# Altium schematic symbol library lib_datalogger.SchLib: 1246 symbols (part 12 of 16) (continued)
## CMP-018-000087-1 (continued)
RES SMD 180K OHM 1% 1/10W 0603; Manufacturer Part Number: RC0603FR-07180KL; Power (Watts): 0.1W, 1/10W; Temperature Coefficient: ±100ppm/°C; Number of Terminations: 2; Supplier Device Package: 0603; ComponentLink1URL: http://www.yageo.com/NewPortal/yageodocoutput?fileName=/pdf/R-Chip/PYu-RC_Group_51_RoHS_L_4.pdf; Features: Moisture Resistant; Stock 1: 371720; Package / Case: 0603 (1608 Metric); Size / Dimension: 0.063" L x 0.031" W (1.60mm x 0.80mm); Operating Temperature: -55°C ~ 155°C; Pricing 1: 1=0.1, 10=0.014, 25=0.01, 100=0.0057, 250=0.00436, 500=0.00348, 1000=0.00257, 2500=0.00223 (USD); Design Item ID: RES 180K OHM 1% 1/10W 0603 SMD; Source: mits.SchLib; Category: Resistors; ComponentLink1Description: http://www.yageo.com/NewPortal/yageodocoutput?fileName=/pdf/R-Chip/PYu-RC_Group_51_RoHS_L_4.pdf; Resistance (Ohms): 180k; RoHS: RoHS Compliant; Part Status: Active; Height - Seated (Max): 0.022" (0.55mm); Failure Rate: -
footprint CR1608-0603 (Chip Resistor; Body 1.6 x 0.8 mm (LxW typ))
footprint CR1608-0603 (Chip Resistor; Body 1.6 x 0.8 mm (LxW typ))
pins: 1, 2

## CMP-018-000088-1
designator R?, comment RES 1K OHM 1/10W 0.1% 0603 SMD  Package Quantity: 5000  Voltage Rating: 75V  Tolerance: 0.1%  Min Operating Temperature: -55°C  Manufacturer: Yageo  Max Operating Temperature: 155°C  RoHS Compliant: Yes  Packaging: Tape and Reel  Case/Package: 0603  Resistance: 1kR
YAGEO - RC0603JR-071KL - SMD Chip Resistor, 0603 [1608 Metric], 1 kohm, RC Series, 75 V, Thick Film, 100 mW; Power Rating: 100mW; Body Length: 1.6mm; Resistance Tolerance: 5%; Temperature Coefficient: 25ppm/°C; ComponentLink5Description: https://datasheet.ciiva.com/7746/443971-7746461.pdf?src-supplier=Element14; ComponentLink1Description: http://www.farnell.com/datasheets/2860647.pdf?src-supplier=Farnell; ComponentLink7URL: https://datasheet.ciiva.com/22747/443971-22747533.pdf?src-supplier=Element14; Radiation Hardening: No; Width: 0.8mm; Stock 2: 3076553; ComponentLink2Description: http://www.farnell.com/datasheets/1729042.pdf?src-supplier=Element14; Military Standard: Not; ComponentLink5URL: https://datasheet.ciiva.com/7746/443971-7746461.pdf?src-supplier=Element14; Case Code (Metric): 1608; REACH SVHC: No SVHC; RoHS: No; Category: Chip SMD Resistors; ComponentLink7Description: https://datasheet.ciiva.com/22747/443971-22747533.pdf?src-supplier=Element14; Design Item ID: RES 1K OHM 1/10W 0.1% 0603 SMD; ComponentLink6Description: https://datasheet.ciiva.com/7746/443971-7746462.pdf?src-supplier=Element14; Series: RC; ComponentLink3Description: http://www.farnell.com/datasheets/1729040.pdf?src-supplier=Element14; Pricing 2: 1=0,10000, 10=0,02000, 100=0,00800, 1000=0,00360, 2500=0,00312 (USD); ComponentLink1URL: http://www.farnell.com/datasheets/2860647.pdf?src-supplier=Farnell; ComponentLink4Description: https://datasheet.ciiva.com/8883/pyu-rc0603-51-rohs-l-4-8883051.pdf?src-supplier=Avnet; ComponentLink2URL: http://www.farnell.com/datasheets/1729042.pdf?src-supplier=Element14; Case Code (Imperial): 0603; Contact Plating: Tin,Matte; Length: 1.6mm; Lead Free: Lead Free; Height: 0.45mm; Construction: Rectangular; Depth: 0.8mm; Source: mits.SchLib; ComponentLink6URL: https://datasheet.ciiva.com/7746/443971-7746462.pdf?src-supplier=Element14; Voltage Rating (DC): 75V; Size Code: 0603; Termination: SMD/SMT; Number of Pins: 2; ComponentLink4URL: https://datasheet.ciiva.com/8883/pyu-rc0603-51-rohs-l-4-8883051.pdf?src-supplier=Avnet; Resistor Type: Thin Film; ComponentLink3URL: http://www.farnell.com/datasheets/1729040.pdf?src-supplier=Element14; Manufacturer Part Number: RC0603JR-071KL
footprint CR1608-0603 (Chip Resistor; Body 1.6 x 0.8 mm (LxW typ))
footprint CR1608-0603 (Chip Resistor; Body 1.6 x 0.8 mm (LxW typ))
pins: 1, 2

## CMP-018-000089-1
designator R?, comment RES 1K69 OHM 1% 1/10W 0603 SMD  Manufacturer: Yageo  Composition: Thick Film  Packaging: Cut Tape (CT)  Tolerance: ±1%
RES SMD 1.69K OHM 1% 1/10W 0603; Manufacturer Part Number: RC0603FR-071K69L; Power (Watts): 0.1W, 1/10W; Temperature Coefficient: ±100ppm/°C; Resistance (Ohms): 1.69k; Size / Dimension: 0.063" L x 0.031" W (1.60mm x 0.80mm); Pricing 1: 1=0.1, 10=0.014, 25=0.01, 100=0.0057, 250=0.00436, 500=0.00348, 1000=0.00257, 2500=0.00223 (USD); ComponentLink1Description: http://www.yageo.com/documents/recent/PYu-RC_Group_51_RoHS_L_04.pdf; Design Item ID: RES 1K69 OHM 1% 1/10W 0603 SMD; RoHS: RoHS Compliant; Package / Case: 0603 (1608 Metric); Supplier Device Package: 0603; ComponentLink1URL: http://www.yageo.com/documents/recent/PYu-RC_Group_51_RoHS_L_04.pdf; Category: Resistors; Number of Terminations: 2; Height: 0.022" (0.55mm); Features: Moisture Resistant; Operating Temperature: -55°C ~ 155°C; Stock 1: 65719; Source: mits.SchLib
footprint CR1608-0603 (Chip Resistor; Body 1.6 x 0.8 mm (LxW typ))
footprint CR1608-0603 (Chip Resistor; Body 1.6 x 0.8 mm (LxW typ))
pins: 1, 2

## CMP-018-000090-1
designator CON?, comment RES 243K OHM 1% 1/10W 0603 SMD  Manufacturer: Panasonic Electronic Components  Tolerance: ±1%  Composition: Thick Film  Packaging: Cut Tape (CT)
RES SMD 243K OHM 1% 1/10W 0603; Manufacturer Part Number: ERJ-3EKF2433V; Temperature Coefficient: ±100ppm/°C; Power (Watts): 0.1W, 1/10W; ComponentLink1Description: http://industrial.panasonic.com/www-cgi/jvcr13pz.cgi?E+PZ+3+AOA0002+ERJ3EKF2433V+7+WW; Supplier Device Package: 0603; Size / Dimension: 0.063" L x 0.031" W (1.60mm x 0.80mm); Stock 1: 96172; ComponentLink1URL: http://industrial.panasonic.com/www-cgi/jvcr13pz.cgi?E+PZ+3+AOA0002+ERJ3EKF2433V+7+WW; Package / Case: 0603 (1608 Metric); Height: 0.022" (0.55mm); Source: mits.SchLib; Design Item ID: RES 243K OHM 1% 1/10W 0603 SMD; Category: Resistors; RoHS: RoHS Compliant; Pricing 1: 1=0.1, 50=0.0114, 100=0.0084, 250=0.00644, 500=0.00514, 1000=0.00379 (USD); Number of Terminations: 2; Resistance (Ohms): 243k; Operating Temperature: -55°C ~ 155°C; Features: Automotive AEC-Q200
footprint CR1608-0603 (Chip Resistor; Body 1.6 x 0.8 mm (LxW typ))
pins: 1, 2, 3, 4, 5, 6

## CMP-018-000091-1
designator R?, comment RES 30.9K OHM 1% 1/8W 0805 SMD  Case/Package: 0805  Tolerance: 1%  Packaging: Tape and Reel  Manufacturer: Yageo  Max Operating Temperature: 155°C  Min Operating Temperature: -55°C  Voltage Rating: 150V  Composition: Thick Film  Resistance: 30.9kR
RES SMD 30.9K OHM 1% 1/8W 0805; Manufacturer Part Number: RC0805FR-0730K9L; Power Rating: 125mW; Temperature Coefficient: 100ppm/°C; Length: 2mm; Case Code (Metric): 2012; Military Standard: Not; ComponentLink2URL: http://components.arrow.com/part/dataview/0323_03541722?src-supplier=Arrow+Europe; ComponentLink3URL: http://www.yageo.ru/pdf/RC0805.pdf?src-supplier=Future+Electronics; ComponentLink4URL: http://www.yageo.com/documents/recent/PYu-RC_Group_51_RoHS_L_9.pdf?src-supplier=Digi-Key; ComponentLink1Description: http://www.mouser.com/ds/2/447/Yageo_08112016_RC0805-968729.pdf?src-supplier=Mouser; ComponentLink3Description: http://www.yageo.ru/pdf/RC0805.pdf?src-supplier=Future+Electronics; ComponentLink5Description: http://www.yageo.com/documents/recent/PYu-RC_Group_51_RoHS_L_2.pdf?src-supplier=Avnet; Voltage Rating (DC): 150V; ComponentLink4Description: http://www.yageo.com/documents/recent/PYu-RC_Group_51_RoHS_L_9.pdf?src-supplier=Digi-Key; Source: mits.SchLib; Termination: SMD/SMT; RoHS: Yes; Depth: 1.25mm; Width: 1.25mm; ComponentLink6Description: http://www.yageo.com/documents/recent/PYu-RC0805_51_RoHS_L-(4).pdf?src-supplier=Avnet+Europe; Radiation Hardening: No; Stock 1: 197698; Lead Free: Lead Free; Category: Chip SMD Resistors; Height: 0.5mm; Case Code (Imperial): 0805; Contact Plating: Tin,Matte; Pricing 1: 1=0,10000, 10=0,04000, 100=0,01630, 1000=0,00731, 2500=0,00635 (USD); ComponentLink5URL: http://www.yageo.com/documents/recent/PYu-RC_Group_51_RoHS_L_2.pdf?src-supplier=Avnet; ComponentLink6URL: http://www.yageo.com/documents/recent/PYu-RC0805_51_RoHS_L-(4).pdf?src-supplier=Avnet+Europe; ComponentLink1URL: http://www.mouser.com/ds/2/447/Yageo_08112016_RC0805-968729.pdf?src-supplier=Mouser; Design Item ID: RES 30.9K OHM 1% 1/8W 0805 SMD; ComponentLink2Description: http://components.arrow.com/part/dataview/0323_03541722?src-supplier=Arrow+Europe
footprint CR1608-0603 (Chip Resistor; Body 1.6 x 0.8 mm (LxW typ))
footprint CR2012-0805 (Chip Capacitor)
pins: 1, 2

## CMP-018-000092-1
designator R?, comment RES 33K OHM 0.5% 1/4W 0805 SMD  Min Operating Temperature: -55°C  Packaging: Cut Tape  Max Operating Temperature: 155°C  Resistance: 33kR  Manufacturer: Panasonic  Case/Package: 0805  Tolerance: 0.5%
RES SMD 33K OHM 0.5% 1/4W 0805; Manufacturer Part Number: ERJ-PB6D3302V; Max Power Dissipation: 250mW; Temperature Coefficient: 50ppm/°C; Length: 0.079inch; ComponentLink1Description: https://industrial.panasonic.com/sa/system/files/data/download/catalog/id_fixed-resistors_e_2.pdf?src-supplier=Digi-Key; Case Code (Imperial): 0805; Width: 0.049inch; Design Item ID: RES 33K OHM 0.5% 1/4W 0805 SMD; Resistor Type: Thick Film; Features: Automotive AEC-Q200; RoHS: Yes; Category: Chip SMD Resistors; Pricing 1: 1=0,23000, 10=0,19100, 25=0,13920, 50=0,10100, 100=0,07480, 250=0,05744, 500=0,04524, 1000=0,03132 (USD); Height - Seated (Max): 0.028inch; Case Code (Metric): 2012; Stock 1: 8590; Source: mits.SchLib; Number of Terminations: 2; ComponentLink1URL: https://industrial.panasonic.com/sa/system/files/data/download/catalog/id_fixed-resistors_e_2.pdf?src-supplier=Digi-Key
footprint CR1608-0603 (Chip Resistor; Body 1.6 x 0.8 mm (LxW typ))
footprint CR2012-0805 (Chip Capacitor)
pins: 1, 2

## CMP-018-000093-1
designator R?, comment RES 442K OHM 1% 1/10W 0603 SMD  Packaging: Cut Tape (CT)  Manufacturer: Yageo  Composition: Thick Film  Tolerance: ±1%
RES SMD 442K OHM 1% 1/10W 0603; Manufacturer Part Number: RC0603FR-07442KL; Power (Watts): 0.1W, 1/10W; Temperature Coefficient: ±100ppm/°C; Height: 0.022" (0.55mm); RoHS: RoHS Compliant; Number of Terminations: 2; Operating Temperature: -55°C ~ 155°C; Features: Moisture Resistant; Stock 1: 27435; Size / Dimension: 0.063" L x 0.031" W (1.60mm x 0.80mm); Package / Case: 0603 (1608 Metric); Pricing 1: 1=0.1, 10=0.014, 25=0.01, 100=0.0057, 250=0.00436, 500=0.00348, 1000=0.00257, 2500=0.00223 (USD); Supplier Device Package: 0603; Category: Resistors; Design Item ID: RES 442K OHM 1% 1/10W 0603 SMD; ComponentLink1URL: http://www.yageo.com/documents/recent/PYu-RC_Group_51_RoHS_L_04.pdf; ComponentLink1Description: http://www.yageo.com/documents/recent/PYu-RC_Group_51_RoHS_L_04.pdf; Resistance (Ohms): 442k; Source: mits.SchLib
footprint CR1608-0603 (Chip Resistor; Body 1.6 x 0.8 mm (LxW typ))
footprint CR1608-0603 (Chip Resistor; Body 1.6 x 0.8 mm (LxW typ))
pins: 1, 2

## CMP-018-000094-1
designator R?, comment RES 47K OHM 0.5% 1/8W 0805 SMD  Packaging: Tape and Reel  Tolerance: 0.5%  Manufacturer: Panasonic  Package Quantity: 5000  Min Operating Temperature: -55°C  Case/Package: 0805  Max Operating Temperature: 155°C  Voltage Rating: 200V  Composition: Thin Film  Resistance: 47kR
RES SMD 47K OHM 0.5% 1/8W 0805; Manufacturer Part Number: ERA-6AED473V; Voltage Rating (DC): 150V; Temperature Coefficient: 25ppm/°C; Power Rating: 125mW; ComponentLink10Description: https://datasheet.ciiva.com/28587/1678782-28587221.pdf?src-supplier=Element14; Pricing 1: 1=0,11000, 10=0,10300, 25=0,07120, 50=0,05540, 100=0,03960, 250=0,03088, 500=0,02456, 1000=0,01742 (USD); Depth: 1.25mm; Contact Plating: Tin; Features: Automotive AEC-Q200; ComponentLink11Description: https://datasheet.ciiva.com/16511/aoa0000ce2-16511980.pdf?src-supplier=Avnet+Asia; Radiation Hardening: No; ComponentLink8Description: https://datasheet.ciiva.com/30059/aoa0000ce2-30059497.pdf?src-supplier=Onlinecomponents.com; Width: 1.25mm; ComponentLink5Description: https://datasheet.ciiva.com/9189/aoa0000ce2-9189448.pdf?src-supplier=Avnet; Category: Chip SMD Resistors; ComponentLink2Description: https://datasheet.ciiva.com/9189/aoa0000ce26-9189398.pdf?src-supplier=Avnet; Case Code (Metric): 2012; ComponentLink5URL: https://datasheet.ciiva.com/9189/aoa0000ce2-9189448.pdf?src-supplier=Avnet; Lead Free: Lead Free; Case Code (Imperial): 0805; ComponentLink7Description: https://datasheet.ciiva.com/16765/70260748-16765017.pdf?src-supplier=Allied+Electronics; Height: 0.6mm; ComponentLink1Description: http://www.yageo.com/documents/recent/PYu-RC_Group_51_RoHS_L_7.pdf; Military Standard: Not; ComponentLink6Description: https://datasheet.ciiva.com/17209/aoa0000ce2-17209704.pdf?src-supplier=Avnet+Europe; ComponentLink7URL: https://datasheet.ciiva.com/16765/70260748-16765017.pdf?src-supplier=Allied+Electronics; ComponentLink3Description: https://datasheet.ciiva.com/3883/3984280s8821682n1386-3883650.pdf?src-supplier=Arrow; Mount: Surface Mount; Design Item ID: RES 47K OHM 0.5% 1/8W 0805 SMD; Stock 2: 26406; ComponentLink4URL: https://datasheet.ciiva.com/11821/0900766b80f80784-11821639.pdf?src-supplier=RSComponents; Number of Pins: 2; ComponentLink9URL: https://datasheet.ciiva.com/7802/426256-7802693.pdf?src-supplier=Element14; Source: mits.SchLib; ComponentLink1URL: http://www.yageo.com/documents/recent/PYu-RC_Group_51_RoHS_L_7.pdf; ComponentLink2URL: https://datasheet.ciiva.com/9189/aoa0000ce26-9189398.pdf?src-supplier=Avnet; Length: 2mm; ComponentLink11URL: https://datasheet.ciiva.com/16511/aoa0000ce2-16511980.pdf?src-supplier=Avnet+Asia; ComponentLink9Description: https://datasheet.ciiva.com/7802/426256-7802693.pdf?src-supplier=Element14; Termination: SMD/SMT; Max Power Dissipation: 125mW; Pricing 2: 1=0,10000, 10=0,07200, 100=0,02750, 1000=0,01210, 2500=0,01045 (USD); ComponentLink6URL: https://datasheet.ciiva.com/17209/aoa0000ce2-17209704.pdf?src-supplier=Avnet+Europe; REACH SVHC: No SVHC; ComponentLink10URL: https://datasheet.ciiva.com/28587/1678782-28587221.pdf?src-supplier=Element14; ComponentLink3URL: https://datasheet.ciiva.com/3883/3984280s8821682n1386-3883650.pdf?src-supplier=Arrow; ComponentLink4Description: https://datasheet.ciiva.com/11821/0900766b80f80784-11821639.pdf?src-supplier=RSComponents; ComponentLink8URL: https://datasheet.ciiva.com/30059/aoa0000ce2-30059497.pdf?src-supplier=Onlinecomponents.com; Stock 1: 13581; RoHS: Yes; Number of Terminations: 2
footprint CR1608-0603 (Chip Resistor; Body 1.6 x 0.8 mm (LxW typ))
footprint CR2012-0805 (Chip Capacitor)
pins: 1, 2

## CMP-018-000095-2
designator R?, comment RC0603FR-07825RL  Case/Package: 0603  Manufacturer: Yageo  Voltage Rating: 75V  Min Operating Temperature: -55°C  Resistance: 825R  RoHS Compliant: Yes  Package Quantity: 1  Max Operating Temperature: 155°C  Tolerance: 1%  Packaging: Tape and Reel
Res General Purpose Thick Film 0603 825 Ohm 1% 1/10W ±100ppm/°C Molded SMD Paper T/R; eVendor: Digi-Key; Voltage Rating (DC): 50V; Power Rating: 100mW; eVendorPrice: 0,10; MSRP: 0,00223; eVendor#: 311-825HRCT-ND; Width: 0.031inch; Part#: RC0603FR-07825RL; Resistor Type: Thick Film; Datasheet: http://www.yageo.com/NewPortal/yageodocoutput?fileName=/pdf/R-Chip/PYu-RC_Group_51_RoHS_L_3.pdf; Source: mits.SchLib; Depth: 0.8mm; Case Code (Metric): 1608; Temperature Coefficient: 100ppm/°C; Termination: SMD/SMT; Features: Moisture Resistant; Design Item ID: RES 825R OHM 1% 1/10W 0603 SMD; Lead Free: Lead Free; Series: RC; MOQ: 2500; Size Code: 0603; Length: 1.6mm; Case Code (Imperial): 0603; Height: 0.022inch; Construction: Rectangular; Max Power Dissipation: 100mW; Weight: 7.1E-05oz; Number of Terminations: 2; Military Standard: Not
footprint CR1608-0603 (Chip Resistor; Body 1.6 x 0.8 mm (LxW typ))
footprint CR1608-0603 (Chip Resistor; Body 1.6 x 0.8 mm (LxW typ))
pins: 1, 2

## CMP-018-000096-1
designator R?, comment RES 90K9 OHM 1% 1/10W 0603 SMD  Composition: Thick Film  Tolerance: ±1%  Manufacturer: Vishay Dale  Packaging: Cut Tape (CT)
RES SMD 90.9K OHM 1% 1/10W 0603; Manufacturer Part Number: CRCW060390K9FKEA; Power (Watts): 0.1W, 1/10W; Temperature Coefficient: ±100ppm/°C; ComponentLink1Description: http://www.vishay.com/docs/20035/dcrcwe3.pdf; Operating Temperature: -55°C ~ 155°C; ComponentLink1URL: http://www.vishay.com/docs/20035/dcrcwe3.pdf; RoHS: RoHS Compliant; Features: Automotive AEC-Q200; Category: Resistors; Size / Dimension: 0.061" L x 0.033" W (1.55mm x 0.85mm); Source: mits.SchLib; Package / Case: 0603 (1608 Metric); Number of Terminations: 2; Stock 1: 4303; Supplier Device Package: 0603; Resistance (Ohms): 90.9k; Pricing 1: 1=0.1, 10=0.03, 25=0.022, 50=0.0168, 100=0.0123, 250=0.0094, 500=0.00752, 1000=0.00554, 2500=0.00481 (USD); Design Item ID: RES 90K9 OHM 1% 1/10W 0603 SMD; Height: 0.020" (0.50mm)
footprint CR1608-0603 (Chip Resistor; Body 1.6 x 0.8 mm (LxW typ))
footprint CR1608-0603 (Chip Resistor; Body 1.6 x 0.8 mm (LxW typ))
pins: 1, 2

## CMP-018-000097-1
designator R?, comment RES 0R OHM JUMPER 3/4W 1206 SMD  Composition: shunt  Packaging: Cut Tape (CT)
RES SMD 0.1 OHM SHUNT 3W 2512; Manufacturer Part Number: CRCW12060000Z0EAHP; Resistance (Ohms): 0.1; Supply: LCSC; Features: current sensor; ComponentLink1Description: http://www.vishay.com/docs/20043/crcwhpe3.pdf; Part Status: Active; Design Item ID: RES 0R OHM JUMPER 3/4W 1206 SMD; Power (Watts): 3W; Package / Case: 2512; ComponentLink1URL: http://www.vishay.com/docs/20043/crcwhpe3.pdf; Source: mits.SchLib; Supplier Device Package: 2512
footprint CR1608-0603 (Chip Resistor; Body 1.6 x 0.8 mm (LxW typ))
footprint CR3216-1206 (Chip Capacitor; Body 3.2 x 1.6 mm (LxW typ))
pins: 1, 2

## CMP-018-000098-1
designator R?, comment RES 100 OHM 0.1% 1/10W 0603 SMD  RoHS Compliant: Yes  Case/Package: 0603  Packaging: Tape and Reel  Package Quantity: 5000  Manufacturer: Yageo  Resistance: 100R  Voltage Rating: 75V  Min Operating Temperature: -55°C  Max Operating Temperature: 125°C  Tolerance: 0.1%
RESISTORS 100OHMS ±0.1% 1/10W 0603 ROHS; Manufacturer Part Number: RT0603BRD07100RL; Max Power Dissipation: 100mW; Temperature Coefficient: 25ppm/°C; Category: Chip SMD Resistors; Depth: 0.8mm; Power Rating: 100mW; Voltage Rating (DC): 75V; Resistor Type: Thin Film; Military Standard: Not; Source: mits.SchLib; Design Item ID: RES 100 OHM 0.1% 1/10W 0603 SMD; Size Code: 0603; Case Code (Metric): 1608; Construction: Rectangular; Case Code (Imperial): 0603; Width: 0.8mm; Lead Free: Lead Free; Series: RT; Features: Moisture Resistant; Weight: 7.1E-05oz; Length: 1.6mm; Height: 0.022inch; Number of Terminations: 2; Termination: SMD/SMT
footprint CR1608-0603 (Chip Resistor; Body 1.6 x 0.8 mm (LxW typ))
footprint CR1608-0603 (Chip Resistor; Body 1.6 x 0.8 mm (LxW typ))
pins: 1, 2

## CMP-018-000099-1
designator R?, comment RES 10K5 OHM 0.1% 1/8W 0805 SMD  Tolerance: ±0.1%  Packaging: Cut Tape (CT)  Manufacturer: Panasonic Electronic Components  Composition: Thin Film
RES SMD 10.5K OHM 0.1% 1/8W 0805; Manufacturer Part Number: ERA-6AEB1052V; Power (Watts): 0.125W, 1/8W; Temperature Coefficient: ±25ppm/°C; Part Status: Active; Design Item ID: RES 10K5 OHM 0.1% 1/8W 0805 SMD; Height: 0.024" (0.60mm); Source: mits.SchLib; Number of Terminations: 2; Resistance (Ohms): 10.5k; Stock 1: 1614; Supplier Device Package: 0805; Category: Resistors; Size / Dimension: 0.079" L x 0.049" W (2.00mm x 1.25mm); RoHS: RoHS Compliant; Pricing 1: 1=0.63, 50=0.2494, 100=0.1924, 250=0.14964, 500=0.10546, 1000=0.07695 (USD); Features: Automotive AEC-Q200; Package / Case: 0805 (2012 Metric); ComponentLink1URL: http://media.digikey.com/pdf/Data%20Sheets/Panasonic%20Electronic%20Components/ERA%201A,2A,3A,6A,8A.pdf; Operating Temperature: -55°C ~ 155°C; ComponentLink1Description: http://media.digikey.com/pdf/Data%20Sheets/Panasonic%20Electronic%20Components/ERA%201A,2A,3A,6A,8A.pdf
footprint CR1608-0603 (Chip Resistor; Body 1.6 x 0.8 mm (LxW typ))
footprint CR2012-0805 (Chip Capacitor)
pins: 1, 2

## CMP-018-000100-1
designator R?, comment RES 1K OHM 1% 150V 1/2W 0805 SMD  Tolerance: 1%  Voltage Rating: 150V  Max Operating Temperature: 155°C  Resistance: 1kR  Case/Package: 0805  Manufacturer: Panasonic  Packaging: Cut Tape  Min Operating Temperature: -55°C  Composition: Thick Film
RES SMD 1K OHM 1% 1/2W 0805; Manufacturer Part Number: ERJ-P6WF1001V; Max Power Dissipation: 500mW; Temperature Coefficient: 200ppm/°C; Depth: 1.25mm; Number of Terminations: 2; Length: 0.079inch; ComponentLink2URL: https://datasheet.ciiva.com/7942/1790600-7942445.pdf?src-supplier=Element14; Height: 0.03inch; RoHS: Yes; Pricing 1: 1=0,54000, 10=0,41200, 100=0,17310, 1000=0,09552, 2500=0,08955 (USD); Case Code (Imperial): 0805; Features: Automotive AEC-Q200; ComponentLink2Description: https://datasheet.ciiva.com/7942/1790600-7942445.pdf?src-supplier=Element14; Source: mits.SchLib; Power Rating: 500mW; ComponentLink1URL: https://datasheet.ciiva.com/48525/erjp-series-eng-tds-48525646.pdf?src-supplier=Distrelec; Voltage Rating (DC): 150V; Width: 0.049inch; Termination: Flat; Category: Chip SMD Resistors; ComponentLink1Description: https://datasheet.ciiva.com/48525/erjp-series-eng-tds-48525646.pdf?src-supplier=Distrelec; Contact Plating: Tin; Stock 1: 90348; Design Item ID: RES 1K OHM 1% 150V 1/2W 0805 SMD; Case Code (Metric): 2012; REACH SVHC: No SVHC
footprint CR1608-0603 (Chip Resistor; Body 1.6 x 0.8 mm (LxW typ))
footprint CR2012-0805 (Chip Capacitor)
pins: 1, 2

## CMP-018-000101-1
designator R?, comment RES 32.8K OHM 0.1% 1/8W 0805 SMD  Composition: Thin Film  Max Operating Temperature: 125°C  Packaging: Tape and Reel  Manufacturer: Vishay Dale  Case/Package: 0805  Resistance: 32.8kR  Tolerance: 0.1%  Package Quantity: 1000  Min Operating Temperature: -55°C
RES SMD 32.8K OHM 0.1% 1/8W 0805; Manufacturer Part Number: TNPW080532K8BEEN; Max Power Dissipation: 125mW; Temperature Coefficient: 25ppm/°C; Length: 0.079inch; Stock 1: 121; Source: mits.SchLib; Number of Terminations: 2; Pricing 1: 1=0,89000, 10=0,78400, 100=0,56930 (USD); ComponentLink1Description: http://rohmfs.rohm.com/en/products/databook/datasheet/passive/resistor/chip_resistor/mcr_g.pdf; Width: 0.049inch; ComponentLink2URL: https://datasheet.ciiva.com/17484/rc0805-17484039.pdf?src-supplier=Future+Electronics; ComponentLink2Description: https://datasheet.ciiva.com/17484/rc0805-17484039.pdf?src-supplier=Future+Electronics; Case Code (Imperial): 0805; Category: Chip SMD Resistors; ComponentLink5URL: https://datasheet.ciiva.com/18603/tnpw-e3-18603434.pdf?src-supplier=Digi-Key; ComponentLink3Description: https://datasheet.ciiva.com/18603/tnpw-e3-18603435.pdf?src-supplier=Digi-Key; ComponentLink4URL: https://datasheet.ciiva.com/18603/tnpw-e3-18603436.pdf?src-supplier=Digi-Key; Case Code (Metric): 2012; RoHS: Yes; Design Item ID: RES 32.8K OHM 0.1% 1/8W 0805 SMD; ComponentLink1URL: http://rohmfs.rohm.com/en/products/databook/datasheet/passive/resistor/chip_resistor/mcr_g.pdf; ComponentLink4Description: https://datasheet.ciiva.com/18603/tnpw-e3-18603436.pdf?src-supplier=Digi-Key; ComponentLink5Description: https://datasheet.ciiva.com/18603/tnpw-e3-18603434.pdf?src-supplier=Digi-Key; ComponentLink3URL: https://datasheet.ciiva.com/18603/tnpw-e3-18603435.pdf?src-supplier=Digi-Key; Height: 0.022inch; Features: Moisture Resistant,Automotive AEC-Q200,Anti-Sulfur
footprint CR1608-0603 (Chip Resistor; Body 1.6 x 0.8 mm (LxW typ))
footprint CR2012-0805 (Chip Capacitor)
pins: 1, 2

## CMP-018-000102-1
designator R?, comment RES 32K8 OHM 0.1% 1/8W 0805 SMD  Manufacturer: Vishay Dale  Composition: Thin Film  Packaging: Cut Tape (CT)  Tolerance: ±0.1%
RES SMD 32.8K OHM 0.1% 1/8W 0805; Manufacturer Part Number: TNPW080532K8BEEN; Power (Watts): 0.125W, 1/8W; Temperature Coefficient: ±25ppm/°C; Pricing 1: 1=0.96, 10=0.835, 25=0.7336, 50=0.6704, 100=0.5819, 250=0.506, 500=0.41998 (USD); ComponentLink1Description: http://www.vishay.com/docs/28758/tnpw_e3.pdf; Operating Temperature: -55°C ~ 125°C; Height: 0.022" (0.55mm); Category: Resistors; ComponentLink1URL: http://www.vishay.com/docs/28758/tnpw_e3.pdf; Package / Case: 0805 (2012 Metric); Size / Dimension: 0.079" L x 0.049" W (2.00mm x 1.25mm); Number of Terminations: 2; Stock 1: 1202; RoHS: RoHS Compliant; Resistance (Ohms): 32.8k; Features: Anti-Sulfur, Automotive AEC-Q200, Moisture Resistant; Design Item ID: RES 32K8 OHM 0.1% 1/8W 0805 SMD; Part Status: Active; Source: mits.SchLib; Supplier Device Package: 0805
footprint CR1608-0603 (Chip Resistor; Body 1.6 x 0.8 mm (LxW typ))
footprint CR2012-0805 (Chip Capacitor)
pins: 1, 2

## CMP-018-000103-1
designator R?, comment RES 42R2 OHM 0.1% 1/6W 0603 SMD  Tolerance: ±0.1%  Manufacturer: TE Connectivity Passive Product  Composition: Thin Film  Packaging: Cut Tape (CT)
RES SMD 42.2 OHM 0.1% 1/6W 0603; Manufacturer Part Number: RP73PF1J42R2BTDF; Power (Watts): 0.167W, 1/6W; Resistance (Ohms): 42.2; Temperature Coefficient: ±25ppm/°C; RoHS: RoHS Compliant; Source: mits.SchLib; Design Item ID: RES 42R2 OHM 0.1% 1/6W 0603 SMD; Pricing 1: 1=0.61, 10=0.45, 25=0.3656, 50=0.318, 100=0.2623, 250=0.22788, 500=0.18548 (USD); ComponentLink1Description: http://www.te.com/commerce/DocumentDelivery/DDEController?Action=srchrtrv&DocNm=1773272&DocType=DS&DocLang=English; ComponentLink1URL: http://www.te.com/commerce/DocumentDelivery/DDEController?Action=srchrtrv&DocNm=1773272&DocType=DS&DocLang=English; Height - Seated (Max): 0.022" (0.55mm); Category: Resistors; Failure Rate: -; Supplier Device Package: 0603; Size / Dimension: 0.061" L x 0.031" W (1.55mm x 0.80mm); Part Status: Active; Package / Case: 0603 (1608 Metric); Features: -; Operating Temperature: -55°C ~ 155°C; Stock 1: 2094
footprint CR1608-0603 (Chip Resistor; Body 1.6 x 0.8 mm (LxW typ))
footprint CR1608-0603 (Chip Resistor; Body 1.6 x 0.8 mm (LxW typ))
pins: 1, 2

## CMP-018-000104-1
designator R?, comment RES 47R OHM 0.5% 1/10W 0603 SMD  Composition: Thin Film  Manufacturer: Yageo  Tolerance: ±0.5%  Packaging: Cut Tape (CT)
RES SMD 47 OHM 0.5% 1/10W 0603; Manufacturer Part Number: RT0603DRE0747RL; Temperature Coefficient: ±50ppm/°C; Resistance (Ohms): 47; Power (Watts): 0.1W, 1/10W; Height - Seated (Max): 0.022" (0.55mm); RoHS: RoHS Compliant; Features: Moisture Resistant; Number of Terminations: 2; Category: Resistors; Stock 1: 4750; Operating Temperature: -55°C ~ 155°C; Supplier Device Package: 0603; Failure Rate: -; Part Status: Active; Source: mits.SchLib; Package / Case: 0603 (1608 Metric); ComponentLink1Description: http://www.yageo.com/documents/recent/PYu-RT_1-to-0.05_RoHS_L_6.pdf; Design Item ID: RES 47R OHM 0.5% 1/10W 0603 SMD; ComponentLink1URL: http://www.yageo.com/documents/recent/PYu-RT_1-to-0.05_RoHS_L_6.pdf; Size / Dimension: 0.063" L x 0.031" W (1.60mm x 0.80mm); Pricing 1: 1=0.11, 10=0.102, 25=0.0708, 50=0.0552, 100=0.0394, 250=0.03072, 500=0.02442, 1000=0.01734 (USD)
footprint CR1608-0603 (Chip Resistor; Body 1.6 x 0.8 mm (LxW typ))
footprint CR1608-0603 (Chip Resistor; Body 1.6 x 0.8 mm (LxW typ))
pins: 1, 2

## CMP-018-000105-1
designator R?, comment RES 53.6K OHM 1% 1/10W 0603 SMD  Tolerance: ±1%  Manufacturer: Yageo  Composition: Thick Film  Packaging: Cut Tape (CT)
RES SMD 53.6K OHM 1% 1/10W 0603; Manufacturer Part Number: RC0603FR-0753K6L; Power (Watts): 0.1W, 1/10W; Temperature Coefficient: ±100ppm/°C; Number of Terminations: 2; Pricing 1: 1=0.1, 10=0.014, 25=0.01, 100=0.0057, 250=0.00436, 500=0.00348, 1000=0.00257, 2500=0.00223 (USD); ComponentLink1URL: http://www.yageo.com/documents/recent/PYu-RC_Group_51_RoHS_L_04.pdf; Design Item ID: RES 53.6K OHM 1% 1/10W 0603 SMD; Category: Resistors; Operating Temperature: -55°C ~ 155°C; Stock 1: 28899; RoHS: RoHS Compliant; Height: 0.022" (0.55mm); Resistance (Ohms): 53.6k; ComponentLink1Description: http://www.yageo.com/documents/recent/PYu-RC_Group_51_RoHS_L_04.pdf; Size / Dimension: 0.063" L x 0.031" W (1.60mm x 0.80mm); Features: Moisture Resistant; Supplier Device Package: 0603; Source: mits.SchLib; Package / Case: 0603 (1608 Metric)
footprint CR1608-0603 (Chip Resistor; Body 1.6 x 0.8 mm (LxW typ))
footprint CR1608-0603 (Chip Resistor; Body 1.6 x 0.8 mm (LxW typ))
pins: 1, 2

## CMP-019-000000-1
designator S?, comment CHAVE PUSH 4P NO
SWITCH TACTILE SPST-NO 0.05A 12V; Part#: FSM4JH; Manufacturer: TE Connectivity; MSRP: 0,0553; eVendor: Digi-Key; eVendor#: 450-1650-ND; eVendorPrice: 0,10; Design Item ID: CHAVE PUSH 4P NO; MOQ: 1000; Datasheet: http://www.te.com/commerce/DocumentDelivery/DDEController?Action=srchrtrv&DocNm=1825910&DocType=Customer+Drawing&DocLang=English; Source: mits.SchLib
footprint PUSH_BUTTON_4P
footprint PUSH_BUTTON_4P
pins: 1, 2, 3, 4

## CMP-019-00000-3
designator U?, comment 24AA02T-I/OT
I2C Serial EEPROM, 2 Kbit, 1.7 V, -40 to 85 degC, 5-Pin SOT-23, RoHS, Tape and Reel; Manufacturer: Microchip; Access Time: 900ns; Clock Frequency: 400kHz; Density: 2Kb; Max Supply Voltage: 5.5V; Nominal Supply Current: 3mA; Min Supply Voltage: 1.8V; Mounting Technology: SM; Max Operating Temperature: 85°C; Package Description: 5-Pin Small Outline Transistor, Body 2.9 x 1.55 mm, Pitch 0.95 mm; Interface: I2C; Datasheet Version: Rev. J, 02/2009; Packaging: TapeandReel; RoHS Compliant: True; Min Operating Temperature: -40°C; Package Quantity: 3000; Max Clock Frequency: 400KHz; Pins: 5; Datasheet URL: http://ww1.microchip.com/downloads/en/DeviceDoc/21709J.pdf; Frequency: 400kHz; Case/Package: SOT-23-5; Package Reference: SOT23-5; Manufacturer URL: http://www.microchip.com/; Package URL: http://www.microchip.com/stellent/groups/techpub_sg/documents/packagingspec/en012702.pdf
footprint MCHP-SOT23-5_M (SOT23, 5-Leads, Body 3.10x1.80mm, Pitch 0.95mm, IPC Low Density)
footprint MCHP-SOT23-5_L (SOT23, 5-Leads, Body 3.10x1.80mm, Pitch 0.95mm, IPC High Density)
footprint MCHP-SOT23-5_N (SOT23, 5-Leads, Body 3.10x1.80mm, Pitch 0.95mm, IPC Medium Density)
pins: 1 SCL (in), 2 VSS (power), 3 SDA (io), 4 VCC (power), 5 WP (in)

## CMP-019-000001-1
designator S?, comment SWITCH TOGGLE SPST 6A 125V
Manufacturer: NKK Switches; Manufacturer Part Number: M2011SS1W01/UC; Actuator Material: Brass, Chrome Plated; Switch Function: On-Off; Voltage Rating - DC: 30V; Electrical Life: 25,000 Cycles; Actuator Length: 10.50mm; Illumination: Non-Illuminated; Actuator Type: Standard Round; Current Rating: 6A (AC), 4A (DC); Circuit: SPST; Category: Switches; Bushing Thread: 1/4-40; ComponentLink1Description: http://www.nkkswitches.com/pdf/MtogglesBushing.pdf; Ingress Protection: -; Pricing 1: 1=3.31, 10=3.174, 25=3.036, 50=2.898, 100=2.622, 250=2.415, 500=2.208, 1000=1.932, 5000=1.863 (USD); Panel Cutout Dimensions: Circular - 6.50mm Dia; Packaging: Bulk; Source: mits.SchLib; RoHS: RoHS Compliant; Stock 1: 3655; Design Item ID: SWITCH TOGGLE SPST 6A 125V; Mounting Type: Panel Mount; Illumination Voltage (Nominal): -; Voltage Rating - AC: 125V; Illumination Type, Color: -; Termination Style: Solder Lug; ComponentLink1URL: http://www.nkkswitches.com/pdf/MtogglesBushing.pdf; Features: Epoxy Sealed Terminals; Part Status: Active; Operating Temperature: -30°C ~ 85°C
footprint SWITCH_TOGGLE_FP
footprint SWITCH_TOGGLE_FP
pins: 2, 3

## CMP-019-00001-3
designator U?, comment AT24MAC602-STUM-T
2-wire Serial EEPROM with a Factory-Programmed EUI-64(TM)Address Plus an Embedded Unique 128-bit Serial Number, 2 Kbit, 1.7 to 5.5 V, -40 to 85 degC, 5-Pin SOT23 (5TS1), Tape and Reel; Manufacturer: Atmel; Nominal Supply Current: 3mA; Access Time: 550ns; Min Supply Voltage: 1.7V; Max Clock Frequency: 1MHz; Density: 2Kb; Max Supply Voltage: 5.5V; Package Description: 5-Pin Plastic Thin Shrink Small Outline Package, Body 2.9 x 1.6 mm, Pitch 0.95 mm; Package Quantity: 5000; Datasheet URL: http://www.atmel.com/Images/Atmel-8807-SEEPROM-AT24MAC402-602-Datasheet.pdf; Max Operating Temperature: 85°C; Case/Package: SOT-23-5; RoHS Compliant: True; Datasheet Version: Rev. 8808E, 01/2015; Interface: Serial; Frequency: 1MHz; Packaging: TapeandReel; Mounting Technology: SM; Package Reference: 5TS1; Manufacturer URL: http://www.atmel.com/; Min Operating Temperature: -40°C; Pins: 5
footprint ATML-5TS1_N (SOT23, 5-Leads, Body 2.9x1.6mm, Pitch 0.95mm, IPC Medium Density)
footprint ATML-5TS1_M (SOT23, 5-Leads, Body 2.9x1.6mm, Pitch 0.95mm, IPC Low Density)
footprint ATML-5TS1_L (SOT23, 5-Leads, Body 2.9x1.6mm, Pitch 0.95mm, IPC High Density)
pins: 1 SCL (in) "Serial Clock Input", 2 GND (power) "Ground", 3 SDA (io) "Serial Data", 4 VCC (power) "Power Supply", 5 WP (in) "Write Protect"

## CMP-019-000002-1
designator S?, comment SWITCH PUSH SPST-NO 3A 125V
Manufacturer: E-Switch; Manufacturer Part Number: PS1024ALRED; Actuator Type: Round, Button; Switch Function: Off-Mom; Current Rating: 3A (AC); Mechanical Life: 6,000 Cycles; Color - Actuator/Cap: Red; Type: Standard; Features: -; Part Status: Active; Category: Switches; Packaging: Bulk; Operating Temperature: -20°C ~ 65°C; Mounting Type: Panel Mount, Rear; Termination Style: Solder Lug; Pricing 1: 1=1.15, 10=1.069, 25=1.018, 50=0.9672, 100=0.9417, 250=0.9162, 500=0.8653, 1000=0.8144, 5000=0.68715 (USD); Ingress Protection: -; Voltage Rating - DC: -; RoHS: RoHS Compliant; ComponentLink1Description: http://media.digikey.com/pdf/Data%20Sheets/E-Switch%20PDFs/PS1024ALRED.pdf; Voltage Rating - AC: 125V; Design Item ID: SWITCH PUSH SPST-NO 3A 125V; Stock 1: 5310; Source: mits.SchLib; Illumination Type, Color: -; Circuit: SPST-NO; Electrical Life: 6,000 Cycles; ComponentLink1URL: http://media.digikey.com/pdf/Data%20Sheets/E-Switch%20PDFs/PS1024ALRED.pdf; Illumination Voltage (Nominal): -; Panel Cutout Dimensions: Circular - 7.20mm Dia
footprint SWITCH_PUSH_TH
footprint SWITCH_PUSH_FP
pins: 1, 2

## CMP-019-00002-3
designator U?, comment AT45DB041E-SSHN-B
SPI Serial Flash Memory, 4-Mbit, 1.65 to 3.6 V, -40 to 85 degC, 8-Pin SOIC (8S1), RoHS, Tube; Manufacturer: Adesto; Max Clock Frequency: 70MHz; Access Time: 7ns; Nominal Supply Current: 15mA; Page Size: 264B; Nominal Supply Voltage: 1.8V; Word Size: 8b; Max Supply Voltage: 3.6V; Density: 4Mb; Clock Frequency: 85MHz; Min Supply Voltage: 1.65V; Pins: 8; RoHS Compliant: True; Package Description: 8-Pin Small Outline Integrated Circuit, Body 4.925 x 3.9 mm, Pitch 1.27 mm; Mounting Technology: SM; Manufacturer URL: http://www.adestotech.com/; Packaging: Rail/Tube; Package Reference: 8S1; Min Operating Temperature: -40°C; Max Operating Temperature: 85°C; Case/Package: SOIC; Package Quantity: 98; Datasheet URL: http://www.adestotech.com/wp-content/uploads/doc8783.pdf; Datasheet Version: Rev. 8783I, 03/2016; Interface: SPI
footprint ADST-8S1_L (SOIC, 8-Leads, Body 5.1x4mm, Pitch 1.27mm, IPC High Density)
footprint ADST-8S1_N (SOIC, 8-Leads, Body 5.1x4mm, Pitch 1.27mm, IPC Medium Density)
footprint ADST-8S1_M (SOIC, 8-Leads, Body 5.1x4mm, Pitch 1.27mm, IPC Low Density)
pins: 1 SI (in) "Serial Input: The SI pin is used to shift data into the device. The SI pin is used for all data input including command and address sequences. Data on the SI pin is always latched on the rising edge of SCK. Data present on (See Datasheet)", 2 SCK (in) "Serial Clock: This pin is used to provide a clock to the device and is used to control the flow of data to and from the device. Command, address, and input data present on the SI pin is always latched on the rising edge of (See Datasheet)", 3 ~{RESET} (in) "Reset: A low state on the reset pin (R\E\S\E\T\) will terminate the operation in progress and reset the internal state machine to an idle state. The device will remain in the reset condition as long as a low level is present (See Datasheet)", 4 ~{CS} (in) "Chip Select: Asserting the C\S\ pin selects the device. When the C\S\ pin is deasserted, the device will be deselected and normally be placed in the standby mode (not Deep Power-Down mode) and the output pin (SO) will be in (See Datasheet)", 5 ~{WP} (in) "Write Protect: When the W\P\ pin is asserted, all sectors specified for protection by the Sector Protection Register will be protected against program and erase operations regardless of whether the Enable Sector Protection (See Datasheet)", 6 VCC (power) "Device Power Supply: The VCC pin is used to supply the source voltage to the device. Operations at invalid VCC voltages may produce spurious results and should not be attempted.", 7 GND (power) "Ground: The ground reference for the power supply. GND should be connected to the system ground.", 8 SO (hiz) "Serial Output: The SO pin is used to shift data out from the device. Data on the SO pin is always clocked out on the falling edge of SCK. The SO pin will be in a high-impedance state whenever the device is deselected (C\S\ (See Datasheet)"
